# Altium footprint library THD Opto Components.PcbLib: 30 footprints (part 1 of 2)
Each footprint in its own frame and in the unit in brackets; x right, y up, seen from the top. Pads: shape width x height; smd on the part's side, far side on the other; paste and mask are expansions set on the pad; w line width, h text height; cw(c..) or ccw(c..) is an arc to the next point about the centre after c.
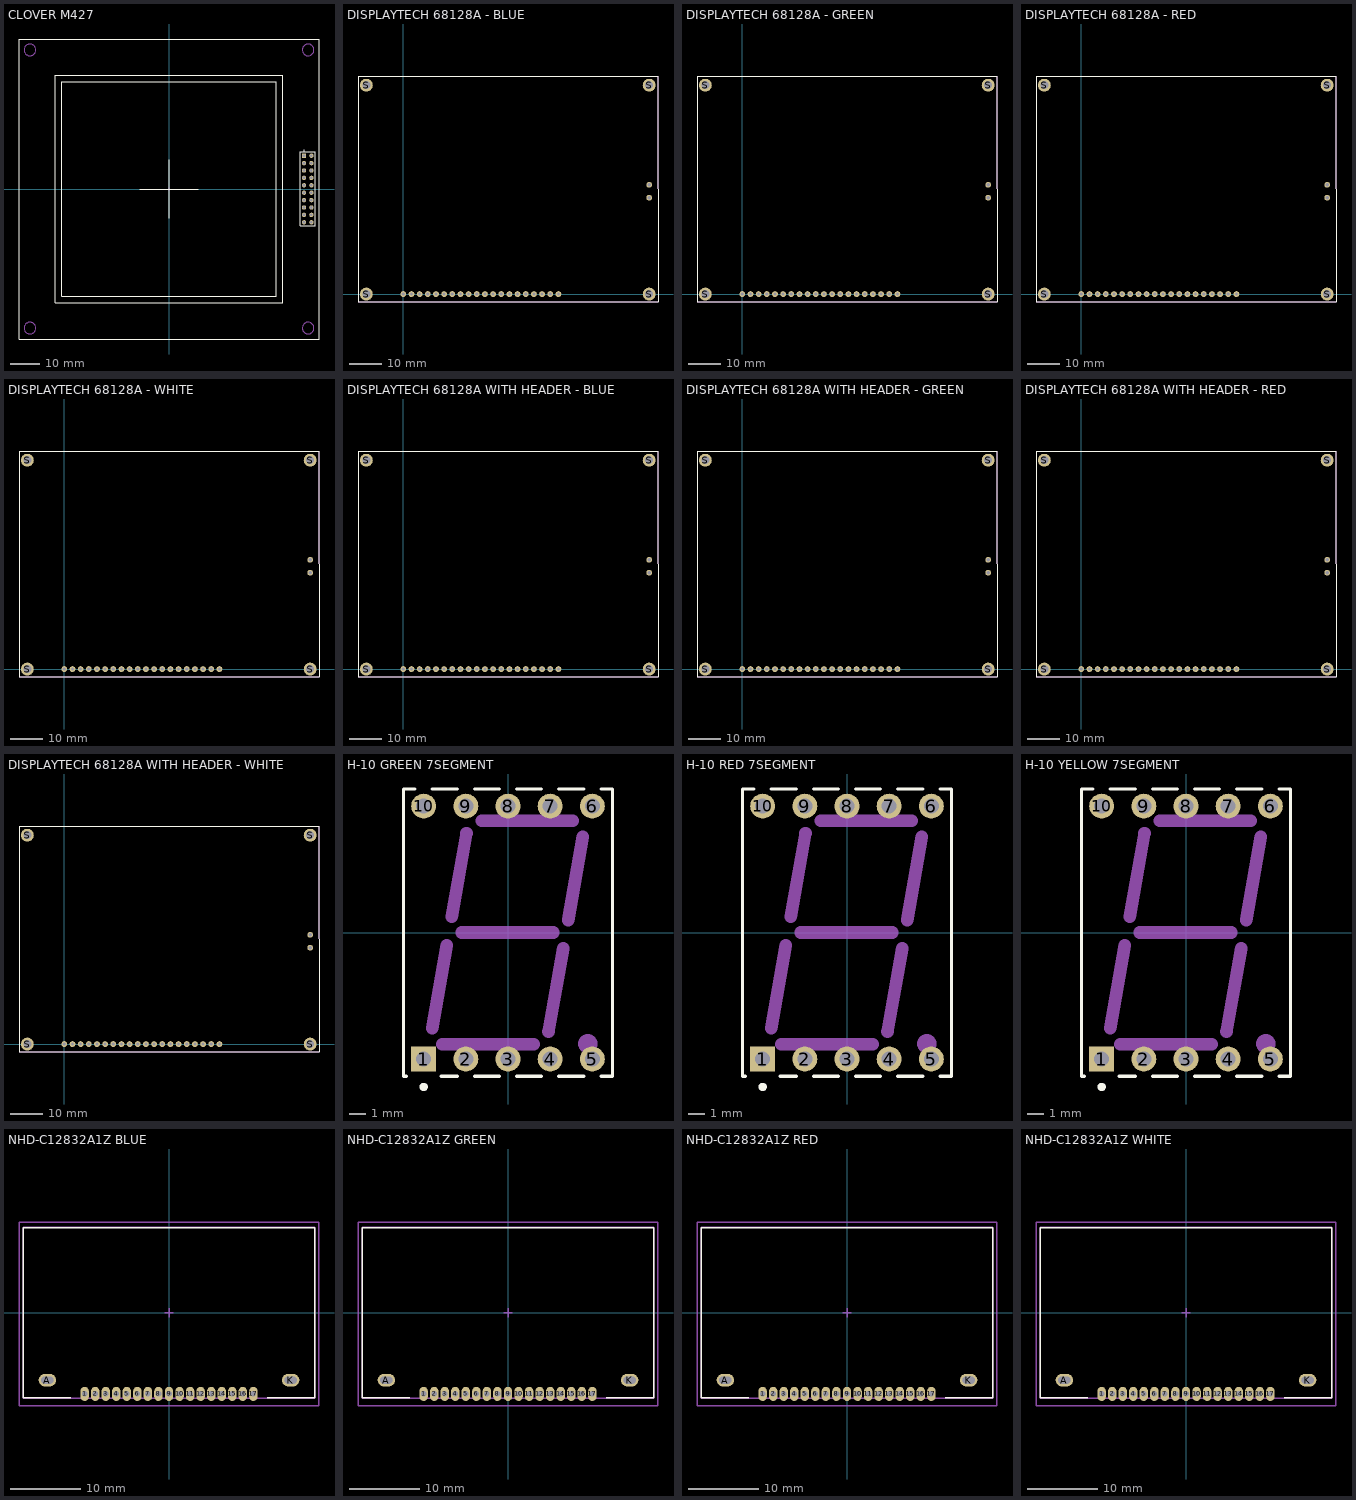
[diagram p0: the footprints below, top view; thin cyan lines are the x and y axes]

## CLOVER M427 [mm] "M427 with Header (2x10P), 160x160 Dots LCD Module, Clover Display Ltd."
height 11.3
pads (20):
  rect 1.5x1.5 hole 0.9: 1(46.36,11.43)
  round 1.5 hole 0.9: 2(48.9,11.43) 3(46.36,8.89) 4(48.9,8.89) 5(46.36,6.35) 6(48.9,6.35) 7(46.36,3.81) 8(48.9,3.81) 9(46.36,1.27) 10(48.9,1.27) 11(46.36,-1.27) 12(48.9,-1.27) 13(46.36,-3.81) 14(48.9,-3.81) 15(46.36,-6.35) 16(48.9,-6.35) 17(46.36,-8.89) 18(48.9,-8.89) 19(46.36,-11.43) 20(48.9,-11.43)
Top Overlay:
  circle w0.25: c46.36,13.109 r0.125
  lines w0.1: -10,0 10,0 ; 0,-10 0,10 ; -51.5,-51.5 -51.5,51.5 51.5,51.5 51.5,12.9 51.5,-12.9 51.5,-51.5 -51.5,-51.5 ; -39,-39 39,-39 39,39 -39,39 -39,-39 ; -36.785,-36.785 36.785,-36.785 36.785,36.785 -36.785,36.785 -36.785,-36.785
  lines w0.2: 45.09,-12.67 50.17,-12.67 50.17,10.825 50.17,12.73 45.09,12.73 45.09,10.825 45.09,-12.67
Mechanical 1:
  circle w0.1: c47.75,-47.75 r2
  circle w0.1: c47.75,47.75 r2
  circle w0.1: c-47.75,47.75 r2
  circle w0.1: c-47.75,-47.75 r2
Mechanical 15:
  lines w0.1: -0.5,0 0.5,0 ; 0,-0.5 0,0.5
3D body "CLOVER M427.STEP": height 11.82, standoff -5.69, extent -51.5,-51.5 51.5,51.5

## DISPLAYTECH 68128A - BLUE [mm]
pads (26):
  round 1.8 hole 1: 1(0,0) 2(2.54,0) 3(5.08,0) 4(7.62,0) 5(10.16,0) 6(12.7,0) 7(15.24,0) 8(17.78,0) 9(20.32,0) 10(22.86,0) 11(25.4,0) 12(27.94,0) 13(30.48,0) 14(33.02,0) 15(35.56,0) 16(38.1,0) 17(40.64,0) 18(43.18,0) 19(45.72,0) 20(48.26,0) A(76.5,34) K(76.5,30)
  round 4 hole 2.5: S(-11.5,0) S(-11.5,65) S(76.5,0) S(76.5,65)
Top Overlay:
  lines w0.254: -13.97,-2.413 79.248,-2.413 79.248,67.818 -13.97,67.818 -13.97,-2.413
Mechanical 15:
  lines w0.254: -14.097,-2.413 -14.097,67.818 79.248,67.818 79.248,-2.413 -14.097,-2.413
3D body "DISPLAYTECH 68128A - Blue.step": height 8.46, standoff -0.48, extent -14,-2.525 79.029,67.5

## DISPLAYTECH 68128A - GREEN [mm]
pads (26):
  round 1.8 hole 1: 1(0,0) 2(2.54,0) 3(5.08,0) 4(7.62,0) 5(10.16,0) 6(12.7,0) 7(15.24,0) 8(17.78,0) 9(20.32,0) 10(22.86,0) 11(25.4,0) 12(27.94,0) 13(30.48,0) 14(33.02,0) 15(35.56,0) 16(38.1,0) 17(40.64,0) 18(43.18,0) 19(45.72,0) 20(48.26,0) A(76.5,34) K(76.5,30)
  round 4 hole 2.5: S(-11.5,0) S(-11.5,65) S(76.5,0) S(76.5,65)
Top Overlay:
  lines w0.254: -13.97,-2.413 79.248,-2.413 79.248,67.818 -13.97,67.818 -13.97,-2.413
Mechanical 15:
  lines w0.254: -14.097,-2.413 -14.097,67.818 79.248,67.818 79.248,-2.413 -14.097,-2.413
3D body: height 0.92, standoff -1.03, extent 2.159,49.53 2.159,49.53
3D body "DISPLAYTECH 68128A - Green.step": height 8.46, standoff -0.48, extent -14,-2.525 79.029,67.5

## DISPLAYTECH 68128A - RED [mm]
pads (26):
  round 1.8 hole 1: 1(0,0) 2(2.54,0) 3(5.08,0) 4(7.62,0) 5(10.16,0) 6(12.7,0) 7(15.24,0) 8(17.78,0) 9(20.32,0) 10(22.86,0) 11(25.4,0) 12(27.94,0) 13(30.48,0) 14(33.02,0) 15(35.56,0) 16(38.1,0) 17(40.64,0) 18(43.18,0) 19(45.72,0) 20(48.26,0) A(76.5,34) K(76.5,30)
  round 4 hole 2.5: S(-11.5,0) S(-11.5,65) S(76.5,0) S(76.5,65)
Top Overlay:
  lines w0.254: -13.97,-2.413 -13.97,67.818 79.248,67.818 79.248,-2.413 -13.97,-2.413
Mechanical 15:
  lines w0.254: -14.097,-2.413 79.248,-2.413 79.248,67.818 -14.097,67.818 -14.097,-2.413
3D body "DISPLAYTECH 68128A - Red.step": height 8.46, standoff -0.48, extent -14,-2.525 79.029,67.5

## DISPLAYTECH 68128A - WHITE [mm]
pads (26):
  round 1.8 hole 1: 1(0,0) 2(2.54,0) 3(5.08,0) 4(7.62,0) 5(10.16,0) 6(12.7,0) 7(15.24,0) 8(17.78,0) 9(20.32,0) 10(22.86,0) 11(25.4,0) 12(27.94,0) 13(30.48,0) 14(33.02,0) 15(35.56,0) 16(38.1,0) 17(40.64,0) 18(43.18,0) 19(45.72,0) 20(48.26,0) A(76.5,34) K(76.5,30)
  round 4 hole 2.5: S(-11.5,0) S(-11.5,65) S(76.5,0) S(76.5,65)
Top Overlay:
  lines w0.254: -13.97,-2.413 -13.97,67.818 79.248,67.818 79.248,-2.413 -13.97,-2.413
Mechanical 15:
  lines w0.254: -14.097,-2.413 79.248,-2.413 79.248,67.818 -14.097,67.818 -14.097,-2.413
3D body "DISPLAYTECH 68128A - White.step": height 8.46, standoff -0.48, extent -14,-2.525 79.029,67.5

## DISPLAYTECH 68128A WITH HEADER - BLUE [mm]
pads (26):
  round 1.8 hole 1: 1(0,0) 2(2.54,0) 3(5.08,0) 4(7.62,0) 5(10.16,0) 6(12.7,0) 7(15.24,0) 8(17.78,0) 9(20.32,0) 10(22.86,0) 11(25.4,0) 12(27.94,0) 13(30.48,0) 14(33.02,0) 15(35.56,0) 16(38.1,0) 17(40.64,0) 18(43.18,0) 19(45.72,0) 20(48.26,0) A(76.5,34) K(76.5,30)
  round 4 hole 2.5: S(-11.5,0) S(-11.5,65) S(76.5,0) S(76.5,65)
Top Overlay:
  lines w0.254: -13.97,-2.413 79.248,-2.413 79.248,67.818 -13.97,67.818 -13.97,-2.413
Mechanical 15:
  lines w0.254: -14.097,-2.413 -14.097,67.818 79.248,67.818 79.248,-2.413 -14.097,-2.413
3D body "DISPLAYTECH 68128A With Header - Blue.stp": height 8.46, standoff -7.07, extent -14,-2.525 79.029,67.5

## DISPLAYTECH 68128A WITH HEADER - GREEN [mm]
pads (26):
  round 1.8 hole 1: 1(0,0) 2(2.54,0) 3(5.08,0) 4(7.62,0) 5(10.16,0) 6(12.7,0) 7(15.24,0) 8(17.78,0) 9(20.32,0) 10(22.86,0) 11(25.4,0) 12(27.94,0) 13(30.48,0) 14(33.02,0) 15(35.56,0) 16(38.1,0) 17(40.64,0) 18(43.18,0) 19(45.72,0) 20(48.26,0) A(76.5,34) K(76.5,30)
  round 4 hole 2.5: S(-11.5,0) S(-11.5,65) S(76.5,0) S(76.5,65)
Top Overlay:
  lines w0.254: -13.97,-2.413 -13.97,67.818 79.248,67.818 79.248,-2.413 -13.97,-2.413
Mechanical 15:
  lines w0.254: -14.097,-2.413 79.248,-2.413 79.248,67.818 -14.097,67.818 -14.097,-2.413
3D body "DISPLAYTECH 68128A With Header - Green.STEP": height 8.46, standoff -7.07, extent -14,-2.525 79.029,67.5

## DISPLAYTECH 68128A WITH HEADER - RED [mm]
pads (26):
  round 1.8 hole 1: 1(0,0) 2(2.54,0) 3(5.08,0) 4(7.62,0) 5(10.16,0) 6(12.7,0) 7(15.24,0) 8(17.78,0) 9(20.32,0) 10(22.86,0) 11(25.4,0) 12(27.94,0) 13(30.48,0) 14(33.02,0) 15(35.56,0) 16(38.1,0) 17(40.64,0) 18(43.18,0) 19(45.72,0) 20(48.26,0) A(76.5,34) K(76.5,30)
  round 4 hole 2.5: S(-11.5,0) S(-11.5,65) S(76.5,0) S(76.5,65)
Top Overlay:
  lines w0.254: -13.97,-2.413 -13.97,67.818 79.248,67.818 79.248,-2.413 -13.97,-2.413
Mechanical 15:
  lines w0.254: -14.097,-2.413 79.248,-2.413 79.248,67.818 -14.097,67.818 -14.097,-2.413
3D body "DISPLAYTECH 68128A With Header - Red.STEP": height 8.46, standoff -7.07, extent -14,-2.525 79.029,67.5

## DISPLAYTECH 68128A WITH HEADER - WHITE [mm]
pads (26):
  round 1.8 hole 1: 1(0,0) 2(2.54,0) 3(5.08,0) 4(7.62,0) 5(10.16,0) 6(12.7,0) 7(15.24,0) 8(17.78,0) 9(20.32,0) 10(22.86,0) 11(25.4,0) 12(27.94,0) 13(30.48,0) 14(33.02,0) 15(35.56,0) 16(38.1,0) 17(40.64,0) 18(43.18,0) 19(45.72,0) 20(48.26,0) A(76.5,34) K(76.5,30)
  round 4 hole 2.5: S(-11.5,0) S(-11.5,65) S(76.5,0) S(76.5,65)
Top Overlay:
  lines w0.254: -13.97,-2.413 79.248,-2.413 79.248,67.818 -13.97,67.818 -13.97,-2.413
Mechanical 15:
  lines w0.254: -14.097,-2.413 -14.097,67.818 79.248,67.818 79.248,-2.413 -14.097,-2.413
3D body "DISPLAYTECH 68128A With Header - White.STEP": height 8.46, standoff -7.07, extent -14,-2.525 79.029,67.5

## H-10 GREEN 7SEGMENT [mm] "LED, 7-Segment Display, 14.22 mm, RHD; 10 Leads; Row Space 15.24 mm; Pitch 2.54 mm"
height 8.25
pads (10):
  rect 1.5x1.5 hole 0.9: 1(-5.08,-7.62)
  round 1.5 hole 0.9: 2(-2.54,-7.62) 3(0,-7.62) 4(2.54,-7.62) 5(5.08,-7.62) 6(5.08,7.62) 7(2.54,7.62) 8(0,7.62) 9(-2.54,7.62) 10(-5.08,7.62)
Top Overlay:
  circle w0.25: c-5.08,-9.3 r0.125
  lines w0.2: -6.12,-8.65 -6.3,-8.65 -6.3,8.65 -5.6,8.65 ; -4.56,8.65 -3.06,8.65 ; -4.04,-8.65 -3.06,-8.65 ; -2.02,-8.65 -0.52,-8.65 ; -2.02,8.65 -0.52,8.65 ; 0.52,-8.65 2.02,-8.65 ; 0.52,8.65 2.02,8.65 ; 3.06,-8.65 4.56,-8.65 ; 3.06,8.65 4.56,8.65 ; 5.6,-8.65 6.3,-8.65 6.3,8.65 5.6,8.65
Mechanical 1:
  circle w0.86: c4.81,-6.7 r0.15
  lines w0.762: -4.57,-5.76 -3.69,-0.77 ; -3.97,-6.729 1.54,-6.729 ; -3.386,0.961 -2.5,5.98 ; -2.78,0 2.72,0 ; -1.58,6.729 3.91,6.729 ; 2.44,-5.96 3.32,-0.96 ; 3.63,0.76 4.51,5.78
3D body "7 Segment 0.56inch LED Module GREEN.STEP": height 8.38, standoff -3.12, extent -6.15,-9.373 6.15,9.627

## H-10 RED 7SEGMENT [mm] "LED, 7-Segment Display, 14.22 mm, RHD; 10 Leads; Row Space 15.24 mm; Pitch 2.54 mm"
height 8.25
pads (10):
  rect 1.5x1.5 hole 0.9: 1(-5.08,-7.62)
  round 1.5 hole 0.9: 2(-2.54,-7.62) 3(0,-7.62) 4(2.54,-7.62) 5(5.08,-7.62) 6(5.08,7.62) 7(2.54,7.62) 8(0,7.62) 9(-2.54,7.62) 10(-5.08,7.62)
Top Overlay:
  circle w0.25: c-5.08,-9.3 r0.125
  lines w0.2: -6.12,-8.65 -6.3,-8.65 -6.3,8.65 -5.6,8.65 ; -4.56,8.65 -3.06,8.65 ; -4.04,-8.65 -3.06,-8.65 ; -2.02,-8.65 -0.52,-8.65 ; -2.02,8.65 -0.52,8.65 ; 0.52,-8.65 2.02,-8.65 ; 0.52,8.65 2.02,8.65 ; 3.06,-8.65 4.56,-8.65 ; 3.06,8.65 4.56,8.65 ; 5.6,-8.65 6.3,-8.65 6.3,8.65 5.6,8.65
Mechanical 1:
  circle w0.86: c4.81,-6.7 r0.15
  lines w0.762: -4.57,-5.76 -3.69,-0.77 ; -3.97,-6.729 1.54,-6.729 ; -3.386,0.961 -2.5,5.98 ; -2.78,0 2.72,0 ; -1.58,6.729 3.91,6.729 ; 2.44,-5.96 3.32,-0.96 ; 3.63,0.76 4.51,5.78
3D body "SW3dPS-7 Segment LED Module.STEP": height 8.38, standoff -3.12, extent -6.15,-9.5 6.15,9.5

## H-10 YELLOW 7SEGMENT [mm] "LED, 7-Segment Display, 14.22 mm, RHD; 10 Leads; Row Space 15.24 mm; Pitch 2.54 mm"
height 8.25
pads (10):
  rect 1.5x1.5 hole 0.9: 1(-5.08,-7.62)
  round 1.5 hole 0.9: 2(-2.54,-7.62) 3(0,-7.62) 4(2.54,-7.62) 5(5.08,-7.62) 6(5.08,7.62) 7(2.54,7.62) 8(0,7.62) 9(-2.54,7.62) 10(-5.08,7.62)
Top Overlay:
  circle w0.25: c-5.08,-9.3 r0.125
  lines w0.2: -6.12,-8.65 -6.3,-8.65 -6.3,8.65 -5.6,8.65 ; -4.56,8.65 -3.06,8.65 ; -4.04,-8.65 -3.06,-8.65 ; -2.02,-8.65 -0.52,-8.65 ; -2.02,8.65 -0.52,8.65 ; 0.52,-8.65 2.02,-8.65 ; 0.52,8.65 2.02,8.65 ; 3.06,-8.65 4.56,-8.65 ; 3.06,8.65 4.56,8.65 ; 5.6,-8.65 6.3,-8.65 6.3,8.65 5.6,8.65
Mechanical 1:
  circle w0.86: c4.81,-6.7 r0.15
  lines w0.762: -4.57,-5.76 -3.69,-0.77 ; -3.97,-6.729 1.54,-6.729 ; -3.386,0.961 -2.5,5.98 ; -2.78,0 2.72,0 ; -1.58,6.729 3.91,6.729 ; 2.44,-5.96 3.32,-0.96 ; 3.63,0.76 4.51,5.78
3D body "7 Segment 0.56inch LED Module YELLOW.STEP": height 8.38, standoff -3.12, extent -6.023,-9.373 6.277,9.627

## NHD-C12832A1Z BLUE [mm]
height 6.4
pads (19):
  oval 1.2x2 hole 0.8: 1(-12,-11.55) 2(-10.5,-11.55) 3(-9,-11.55) 4(-7.5,-11.55) 5(-6,-11.55) 6(-4.5,-11.55) 7(-3,-11.55) 8(-1.5,-11.55) 9(0,-11.55) 10(1.5,-11.55) 11(3,-11.55) 12(4.5,-11.55) 13(6,-11.55) 14(7.5,-11.55) 15(9,-11.55) 16(10.5,-11.55) 17(12,-11.55)
  oval 2.5x1.75 hole 1 slot 1.75 at 0 deg: A(-17.3,-9.6) K(17.3,-9.6)
Top Overlay:
  lines w0.2: -14,-12.1 -20.7,-12.1 -20.7,12.1 0,12.1 20.7,12.1 20.7,-12.1 14,-12.1
Mechanical 13:
  lines w0.2: -20.7,-12.15 20.7,-12.15 20.7,12.15 -20.7,12.15 -20.7,-12.15
Mechanical 15:
  lines w0.2: -0.635,0 0.635,0 ; 0,-0.635 0,0.635 ; -21.336,-13.208 -21.336,12.827 21.336,12.827 21.336,-13.208 -21.336,-13.208
3D body "NHD-C12832A1Z-FSB.STEP": height 4.9, standoff -2.1, extent -20.7,-12.15 20.7,12.15

## NHD-C12832A1Z GREEN [mm]
height 6.4
pads (19):
  oval 1.2x2 hole 0.8: 1(-12,-11.55) 2(-10.5,-11.55) 3(-9,-11.55) 4(-7.5,-11.55) 5(-6,-11.55) 6(-4.5,-11.55) 7(-3,-11.55) 8(-1.5,-11.55) 9(0,-11.55) 10(1.5,-11.55) 11(3,-11.55) 12(4.5,-11.55) 13(6,-11.55) 14(7.5,-11.55) 15(9,-11.55) 16(10.5,-11.55) 17(12,-11.55)
  oval 2.5x1.75 hole 1 slot 1.75 at 0 deg: A(-17.3,-9.6) K(17.3,-9.6)
Top Overlay:
  lines w0.2: -14,-12.1 -20.7,-12.1 -20.7,12.1 0,12.1 20.7,12.1 20.7,-12.1 14,-12.1
Mechanical 13:
  lines w0.2: -20.7,-12.15 -20.7,12.15 20.7,12.15 20.7,-12.15 -20.7,-12.15
Mechanical 15:
  lines w0.2: -0.635,0 0.635,0 ; 0,-0.635 0,0.635 ; -21.336,-13.208 21.336,-13.208 21.336,12.827 -21.336,12.827 -21.336,-13.208
3D body "NHD-C12832A1Z-FSG.STEP": height 4.9, standoff -2.1, extent -20.7,-12.15 20.7,12.15

## NHD-C12832A1Z RED [mm]
height 6.4
pads (19):
  oval 1.2x2 hole 0.8: 1(-12,-11.55) 2(-10.5,-11.55) 3(-9,-11.55) 4(-7.5,-11.55) 5(-6,-11.55) 6(-4.5,-11.55) 7(-3,-11.55) 8(-1.5,-11.55) 9(0,-11.55) 10(1.5,-11.55) 11(3,-11.55) 12(4.5,-11.55) 13(6,-11.55) 14(7.5,-11.55) 15(9,-11.55) 16(10.5,-11.55) 17(12,-11.55)
  oval 2.5x1.75 hole 1 slot 1.75 at 0 deg: A(-17.3,-9.6) K(17.3,-9.6)
Top Overlay:
  lines w0.2: -14,-12.1 -20.7,-12.1 -20.7,12.1 0,12.1 20.7,12.1 20.7,-12.1 14,-12.1
Mechanical 13:
  lines w0.2: -20.7,-12.15 -20.7,12.15 20.7,12.15 20.7,-12.15 -20.7,-12.15
Mechanical 15:
  lines w0.2: -0.635,0 0.635,0 ; 0,-0.635 0,0.635 ; -21.336,-13.208 21.336,-13.208 21.336,12.827 -21.336,12.827 -21.336,-13.208
3D body "NHD-C12832A1Z-FSR.STEP": height 4.9, standoff -2.1, extent -20.7,-12.15 20.7,12.15

## NHD-C12832A1Z WHITE [mm]
height 6.4
pads (19):
  oval 1.2x2 hole 0.8: 1(-12,-11.55) 2(-10.5,-11.55) 3(-9,-11.55) 4(-7.5,-11.55) 5(-6,-11.55) 6(-4.5,-11.55) 7(-3,-11.55) 8(-1.5,-11.55) 9(0,-11.55) 10(1.5,-11.55) 11(3,-11.55) 12(4.5,-11.55) 13(6,-11.55) 14(7.5,-11.55) 15(9,-11.55) 16(10.5,-11.55) 17(12,-11.55)
  oval 2.5x1.75 hole 1 slot 1.75 at 0 deg: A(-17.3,-9.6) K(17.3,-9.6)
Top Overlay:
  lines w0.2: -14,-12.1 -20.7,-12.1 -20.7,12.1 0,12.1 20.7,12.1 20.7,-12.1 14,-12.1
Mechanical 13:
  lines w0.2: -20.7,-12.15 -20.7,12.15 20.7,12.15 20.7,-12.15 -20.7,-12.15
Mechanical 15:
  lines w0.2: -0.635,0 0.635,0 ; 0,-0.635 0,0.635 ; -21.336,-13.208 21.336,-13.208 21.336,12.827 -21.336,12.827 -21.336,-13.208
3D body "NHD-C12832A1Z-FSW.STEP": height 4.9, standoff -2.1, extent -20.7,-12.15 20.7,12.15